# Altium footprint library Amirreza.PcbLib: 524 footprints (part 32 of 33)
Each footprint in its own frame and in the unit in brackets; x right, y up, seen from the top. Pads: shape width x height; smd on the part's side, far side on the other; paste and mask are expansions set on the pad; w line width, h text height; cw(c..) or ccw(c..) is an arc to the next point about the centre after c.
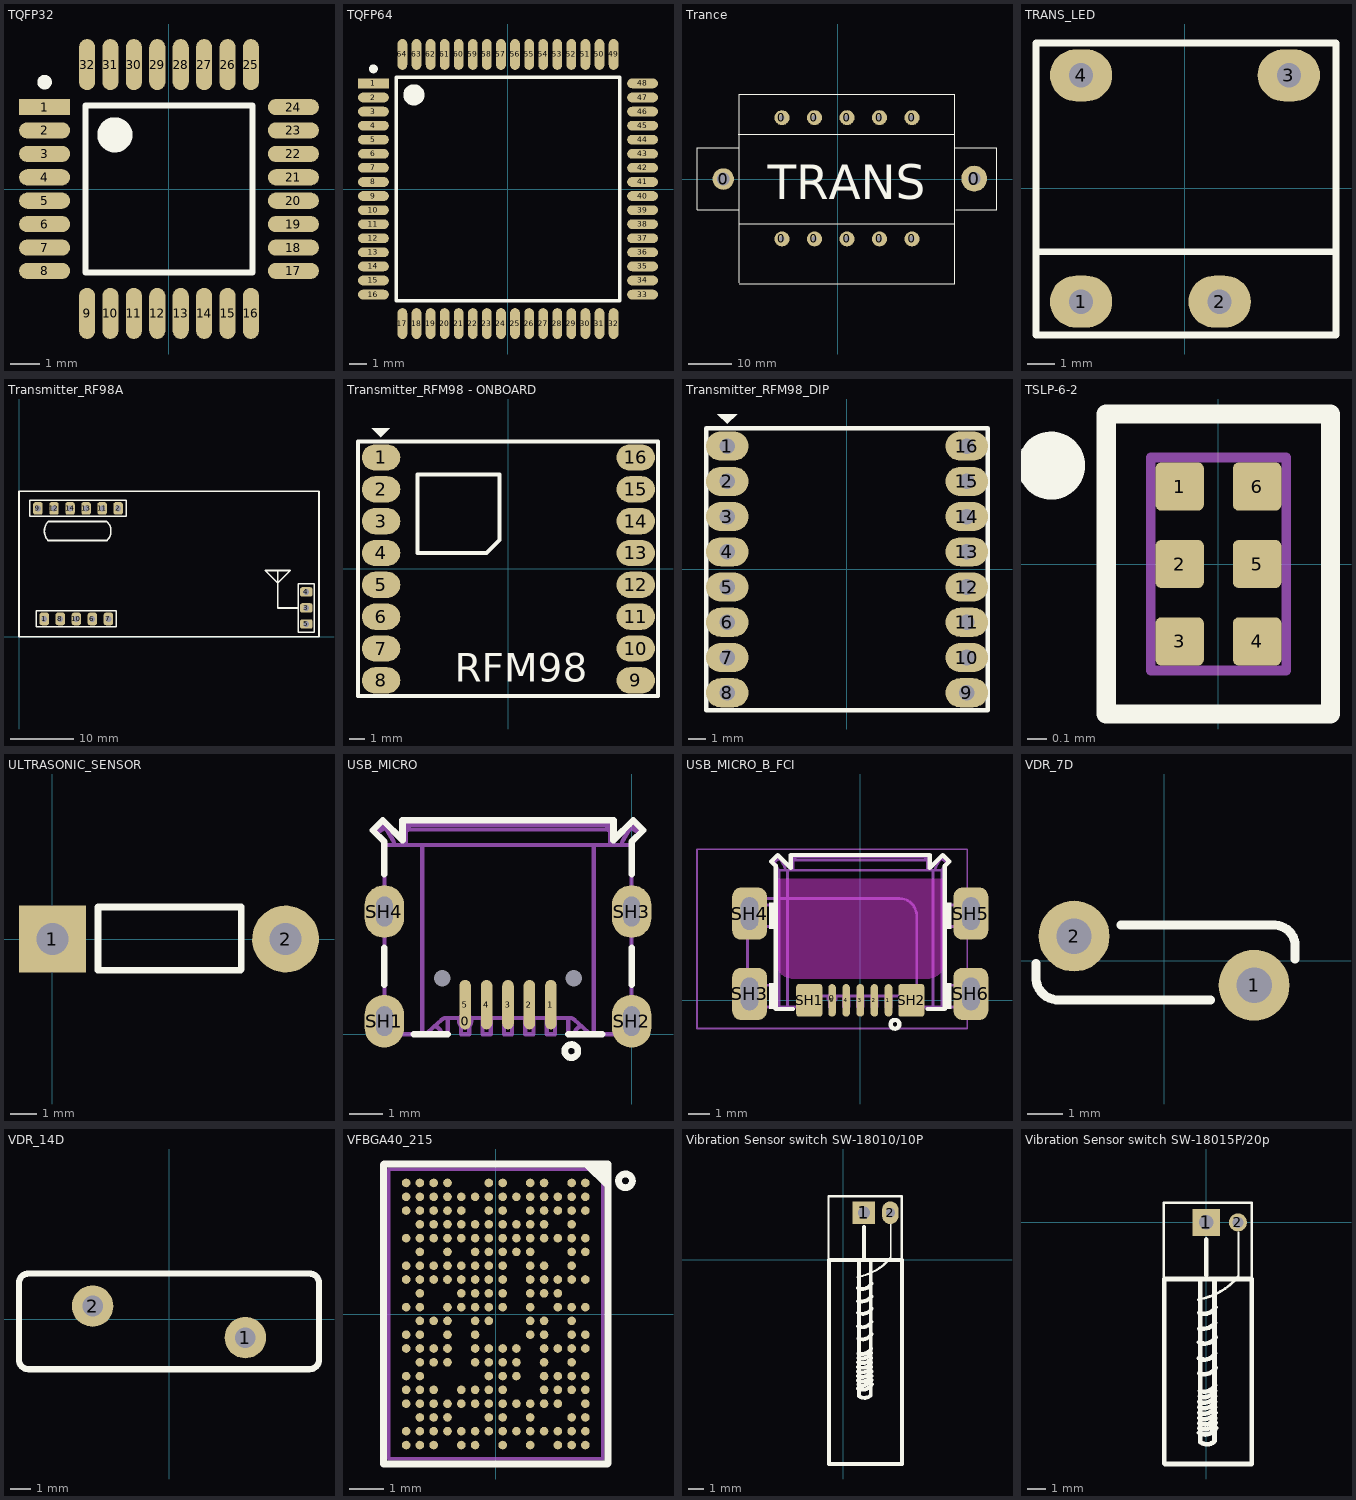
[diagram p31: the footprints below, top view; thin cyan lines are the x and y axes]

## TQFP32 [mm] "Thin QFP, 32-Leads, Body 7x7mm, Pitch 0.8mm, IPC Low Density"
height 1.2
pads (32):
  rect 1.75x0.55 smd: 1(-4.25,2.8)
  oval 1.75x0.55 smd: 2(-4.25,2) 3(-4.25,1.2) 4(-4.25,0.4) 5(-4.25,-0.4) 6(-4.25,-1.2) 7(-4.25,-2) 8(-4.25,-2.8) 17(4.25,-2.8) 18(4.25,-2) 19(4.25,-1.2) 20(4.25,-0.4) 21(4.25,0.4) 22(4.25,1.2) 23(4.25,2) 24(4.25,2.8)
  oval 0.55x1.75 smd: 9(-2.8,-4.25) 10(-2,-4.25) 11(-1.2,-4.25) 12(-0.4,-4.25) 13(0.4,-4.25) 14(1.2,-4.25) 15(2,-4.25) 16(2.8,-4.25) 25(2.8,4.25) 26(2,4.25) 27(1.2,4.25) 28(0.4,4.25) 29(-0.4,4.25) 30(-1.2,4.25) 31(-2,4.25) 32(-2.8,4.25)
Top Overlay:
  circle w0.25: c-4.25,3.65 r0.125
  circle w0.6: c-1.85,1.85 r0.3
  lines w0.2: -2.85,-2.85 -2.85,2.85 2.85,2.85 2.85,-2.85 -2.85,-2.85
3D body "User Library-TQFP32-1 (1).step": height 1.1, standoff 0, extent -4.509,-4.509 4.509,4.509

## TQFP64 [mm]
pads (64):
  rect 1.75x0.55 smd: 1(-7.65,6)
  oval 1.75x0.55 smd: 2(-7.65,5.2) 3(-7.65,4.4) 4(-7.65,3.6) 5(-7.65,2.8) 6(-7.65,2) 7(-7.65,1.2) 8(-7.65,0.4) 9(-7.65,-0.4) 10(-7.65,-1.2) 11(-7.65,-2) 12(-7.65,-2.8) 13(-7.65,-3.6) 14(-7.65,-4.4) 15(-7.65,-5.2) 16(-7.65,-6) 33(7.65,-6) 34(7.65,-5.2) 35(7.65,-4.4) 36(7.65,-3.6) 37(7.65,-2.8) 38(7.65,-2) 39(7.65,-1.2) 40(7.65,-0.4) 41(7.65,0.4) 42(7.65,1.2) 43(7.65,2) 44(7.65,2.8) 45(7.65,3.6) 46(7.65,4.4) 47(7.65,5.2) 48(7.65,6)
  oval 0.55x1.75 smd: 17(-6,-7.65) 18(-5.2,-7.65) 19(-4.4,-7.65) 20(-3.6,-7.65) 21(-2.8,-7.65) 22(-2,-7.65) 23(-1.2,-7.65) 24(-0.4,-7.65) 25(0.4,-7.65) 26(1.2,-7.65) 27(2,-7.65) 28(2.8,-7.65) 29(3.6,-7.65) 30(4.4,-7.65) 31(5.2,-7.65) 32(6,-7.65) 49(6,7.65) 50(5.2,7.65) 51(4.4,7.65) 52(3.6,7.65) 53(2.8,7.65) 54(2,7.65) 55(1.2,7.65) 56(0.4,7.65) 57(-0.4,7.65) 58(-1.2,7.65) 59(-2,7.65) 60(-2.8,7.65) 61(-3.6,7.65) 62(-4.4,7.65) 63(-5.2,7.65) 64(-6,7.65)
Top Overlay:
  circle w0.25: c-7.65,6.825 r0.125
  circle w0.6: c-5.35,5.35 r0.3
  lines w0.2: -6.35,-6.35 -6.35,6.35 6.35,6.35 6.35,-6.35 -6.35,-6.35
3D body "User Library-TQFP64-4.STEP": height 1.6, standoff 0, extent -7.983,-7.991 8.017,8.009

## Trance [mm]
pads (12):
  round 5 hole 3: 0(-26.594,0)
  round 3.5 hole 1.27: 0(-12.929,-13.94) 0(-12.929,14.275) 0(-5.359,-13.94) 0(-5.359,14.28) 0(2.21,-13.94) 0(2.21,14.28) 0(9.779,-13.94) 0(9.779,14.28) 0(17.348,-13.94) 0(17.348,14.28)
  round 6 hole 3: 0(31.826,0.102)
Top Overlay:
  lines w0.254: -23.063,7.295 -32.715,7.295 -32.715,-7.183 -22.936,-7.183 ; -23.063,10.47 27.356,10.47 ; -22.936,-24.328 27.356,-24.328 27.356,19.69 -22.936,19.69 -22.936,-24.201 ; -22.936,-10.358 27.356,-10.358 ; 27.356,7.295 37.135,7.295 37.135,-7.056 ; 27.483,-7.183 37.135,-7.183
  text "TRANS" at -16.264,-4.743 h8

## TRANS_LED [mil]
pads (4):
  oval 90x75 hole 35: 1(-150,-163.39) 2(50,-163.39) 3(150,163.39) 4(-150,163.39)
Top Overlay:
  lines w10: -215.07,-91.39 218,-91.39 ; -215.07,-211.39 -215.07,209.87 218,209.87 218,-211.39 -215.07,-211.39
3D body "User Library-EE1112.STEP": height 479.67, standoff -55.76, extent -215.54,-217.07 217.54,216

## Transmitter_RF98A [mm]
pads (14):
  rrect50% 1.5x2 hole 0.9: 1(4,2.8) 2(15.7,20.3) 6(11.62,2.8) 7(14.16,2.8) 8(6.54,2.8) 9(3,20.3) 10(9.08,2.8) 11(13.16,20.3) 12(5.54,20.3) 13(10.62,20.3) 14(8.08,20.3)
  rrect50% 2x1.5 hole 0.9: 3(45.5,4.54) 4(45.5,7.08) 5(45.5,2)
Top Overlay:
  lines w0.2: 1.73,19.03 16.97,19.03 16.97,21.57 1.73,21.57 1.73,19.03 ; 2.73,1.53 2.73,4.07 15.43,4.07 15.43,1.53 2.73,1.53 ; 44.23,0.73 44.23,8.35 46.77,8.35 46.77,0.73 44.23,0.73
  lines w0.254: 4.65,15.189 cw(c6.174,16.713) 4.65,18.237 ; 13.921,15.189 ccw(c12.397,16.713) 13.921,18.237 ; 40.97,10.389 40.97,8.484 ; 44.23,4.54 40.97,4.54 40.97,8.484 ; 40.97,8.484 42.951,10.465 ; 40.97,8.484 38.989,10.465 42.951,10.465 ; 40.97,8.484 42.951,10.465 ; 0,0 47.5,0 47.5,23 0,23 0,0
  lines w0.305: 4.699,15.189 13.843,15.189 ; 4.699,18.237 13.843,18.237

## Transmitter_RFM98 - ONBOARD [mil]
pads (16):
  oval 95x65 smd: 1(-314.96,275.59) 2(-314.96,196.85) 3(-314.96,118.11) 4(-314.96,39.37) 5(-314.96,-39.37) 6(-314.96,-118.11) 7(-314.96,-196.85) 8(-314.96,-275.59) 9(314.96,-275.59) 10(314.96,-196.85) 11(314.96,-118.11) 12(314.96,-39.37) 13(314.96,39.37) 14(314.96,118.11) 15(314.96,196.85) 16(314.96,275.59)
Top Overlay:
  region: -315.24,325.13 -337.51,347.4 -292.96,347.4
  lines w10: -371.96,-314.33 370.04,-314.33 370.04,315.59 -371.96,315.59 -371.96,-314.33 ; -224.96,39.41 -224.96,233.41 -21.96,233.41 -21.96,71.41 -53.96,39.41 -224.96,39.41
  text "RFM98" at -132.96,-302.59 h120
3D body "User Library-RFM96W.STEP": height 90.24, standoff 2.36, extent -314,-313.99 316,311.99

## Transmitter_RFM98_DIP [mil]
pads (16):
  oval 95x65 hole 35: 1(-267.68,274.96) 2(-267.68,196.22) 3(-267.68,117.48) 4(-267.68,38.74) 5(-267.68,-40) 6(-267.68,-118.74) 7(-267.68,-197.48) 8(-267.68,-276.22) 9(267.76,-276.22) 10(267.76,-197.48) 11(267.76,-118.74) 12(267.76,-40) 13(267.76,38.74) 14(267.76,117.48) 15(267.76,196.22) 16(267.76,274.96)
Top Overlay:
  region: -268.04,324.5 -290.31,346.77 -245.76,346.77
  lines w10: -314.96,-314.96 -314.96,314.96 314.96,314.96 314.96,-314.96 -314.96,-314.96
3D body "User Library-RFM96W.STEP": height 336.31, standoff 248.43, extent -315.04,-312.99 314.96,312.99
3D body "User Library-PBS2-8.STEP": height 169.29, standoff -124.02, extent 228.39,-315.59 307.13,314.33
3D body "User Library-PBS2-8.STEP": height 169.29, standoff -124.02, extent -307.13,-315.59 -228.39,314.33
3D body "User Library-pls2-8_asm.STEP": height 358.27, standoff 11.81, extent -307.13,-315.59 -228.39,314.33
3D body "User Library-pls2-8_asm.STEP": height 358.27, standoff 11.81, extent 228.31,-315.59 307.05,314.33

## TSLP-6-2 [mm] "0.7 x 1.1 mm2_6-PIN"
pads (6):
  rrect25% 0.25x0.25 smd: 1(-0.2,0.4) 2(-0.2,0) 3(-0.2,-0.4) 4(0.2,-0.4) 5(0.2,0) 6(0.2,0.4)
Top Overlay:
  circle w0.25: c-0.864,0.508 r0.05
  lines w0.1: -0.579,-0.775 -0.579,0.775 0.579,0.775 0.579,-0.775 -0.579,-0.775
Top Assembly:
  lines w0.05: -0.35,-0.55 0.35,-0.55 0.35,0.55 -0.35,0.55 -0.35,-0.55
3D body "User Library-SOT8006.STEP": height 0.4, standoff 0, extent -0.4,-0.654 0.4,0.654

## ULTRASONIC_SENSOR [mm]
pads (2):
  rect 2.5x2.5 hole 1.2: 1(0,0)
  round 2.5 hole 1.2: 2(8.722,0)
Top Overlay:
  lines w0.254: 7.036,-1.168 1.702,-1.168 1.702,1.194 7.061,1.194 7.061,-1.118

## USB_MICRO [mm] "CONN, USB Micro AB"
height 2.286
pads (12):
  round 0 hole 0.5 unplated: 0(-5.75,1.7) 0(-1.75,1.7)
  round 0.508 on Mech15: 0(-5.05,0.4)
  oval 0.35x1.5 smd: 1(-2.45,0.9) 2(-3.1,0.9) 3(-3.75,0.9) 4(-4.4,0.9) 5(-5.05,0.9)
  oval 1.2x1.6 hole 0.5 slot 0.9 at 90 deg: SH1(-7.5,0.4) SH2(0,0.4) SH3(0,3.725) SH4(-7.5,3.725)
Top Overlay:
  circle w0.2: c-1.829,-0.508 r0.2
  lines w0.2: -7.5,1.502 -7.5,2.629 ; -7.5,4.857 -7.5,5.842 -7.85,6.192 -7.55,6.492 -6.95,5.892 -6.95,6.492 -0.55,6.492 -0.55,5.892 0.05,6.492 0.35,6.192 0,5.842 0,4.857 ; -6.604,0 -5.575,0 ; -1.925,0 -0.896,0 ; 0,1.502 0,2.629
Mechanical 13:
  lines w0.127: -7.72,6.123 -7.46,6.273 ; -7.2,5.741 ccw(c-7.5,5.742) -7.24,5.892 -7.51,6.359 -7.77,6.209 -7.5,5.741 ; -6.85,6.123 cw(c-6.756,6.115) -6.75,6.209 ; -6.35,0 -6.35,5.741 ; -6.276,0 -6.276,0.007 ; -5.979,0.247 cw(c-6.025,0) -5.774,0 -5.575,0 -5.575,0.5 ; -5.175,0.5 -5.175,0 -4.925,0 -4.925,0.5 ; -4.525,0.5 -4.525,0 -4.275,0 -4.275,0.5 ; -3.875,0.5 -3.875,0 -3.625,0 -3.625,0.5 ; -3.225,0.5 -3.225,0 -2.975,0 -2.975,0.5 ; -2.575,0.5 -2.575,0 -2.325,0 -2.325,0.5 ; -1.925,0.5 -1.925,0 -1.726,0 cw(c-1.475,0) -1.521,0.247 ; -1.224,0 -1.224,0.007 ; -1.15,0 -1.15,5.741 ; -0.65,6.123 ccw(c-0.744,6.115) -0.75,6.209 ; -0.3,5.741 cw(c0,5.742) -0.26,5.892 0.01,6.359 0.27,6.209 0,5.741 ; -0.04,6.273 0.22,6.123 ; -7.5,5.741 -6.85,5.742 ; -7.5,5.741 -7.5,0 -6.327,0 ccw(c-6.327,0.2) -6.193,0.052 -5.757,0.448 cw(c-5.623,0.3) -5.623,0.5 -1.877,0.5 cw(c-1.877,0.3) -1.743,0.448 -1.307,0.052 ccw(c-1.173,0.2) -1.173,0 0,0 0,5.741 ; -6.85,5.742 -0.65,5.742 ; -6.85,5.742 -6.85,6.273 cw(c-6.756,6.265) -6.75,6.359 ; -6.75,6.209 -0.75,6.209 ; -6.75,6.209 -6.75,6.359 ; -6.75,6.359 -0.75,6.359 ; -0.75,6.209 -0.75,6.359 ; -0.75,6.359 cw(c-0.744,6.265) -0.65,6.273 -0.65,5.742 ; -0.65,5.742 0,5.741
3D body "u254-05xx-4bh83-f1s.stp": height 2.35, standoff -0.7, extent -7.461,0.551 -0.047,6.001

## USB_MICRO_B_FCI [mm] "CONN, USB Micro AB"
height 2.286
pads (12):
  round 0.508 on Mech15: 0(-1.3,0.1)
  oval 0.35x1.5 smd: 1(1.3,0) 2(0.65,0) 3(0,0) 4(-0.65,0) 5(-1.3,0)
  rrect20% 1.2x1.5 smd: SH1(-2.35,0) SH2(2.35,0)
  rrect50% 1.6x2.4 hole 0.8 slot 1.5 at 90 deg: SH3(-5.1,0.3) SH4(-5.1,4) SH5(5.1,4) SH6(5.1,0.3)
Top Overlay:
  circle w0.2: c1.6,-1.1 r0.2
  rectangle: -4.2,-0.4 -3.8,0.8
  region: 4.2,0.8 3.8,0.8 3.8,-0.4 4.2,-0.4
  region: 4.2,4.5 3.8,4.5 3.8,3.3 4.2,3.3
  rectangle: -4.2,3.3 -3.8,4.5
  lines w0.2: -3.9,-0.4 -3.1,-0.4 ; -3.9,0.8 -3.9,3.3 ; -3.9,4.5 -3.9,6.2 -4.1,6.4 -3.8,6.7 -3.2,6.1 -3.2,6.7 3.2,6.7 3.2,6.1 3.8,6.7 4.1,6.4 3.9,6.2 3.9,4.5 ; 3.1,-0.4 3.9,-0.4 ; 3.9,0.8 3.9,3.3
Keep-Out Layer:
  board cut-out: 3.9,5.6 3.9,1.803 3.9,1.725 3.869,1.57 3.809,1.425 3.721,1.293 3.61,1.182 3.479,1.094 3.333,1.034 3.179,1.003 3.1,1.003 -3.1,1.003 -3.179,1.003 -3.333,1.034 -3.479,1.094 -3.61,1.182 -3.721,1.293 -3.809,1.425 -3.869,1.57 -3.9,1.725 -3.9,1.803 -3.9,5.6
Mechanical 13:
  lines w0.127: -4.85,-0.3 -4.85,0.7 ; -4.85,3.4 -4.85,4.4 ; -3.97,6.381 -3.71,6.531 ; -3.85,-0.3 -3.85,0.7 ; -3.85,3.4 -3.85,4.4 ; -3.75,-0.3 -3.75,6 ; -3.75,0.7 -5.25,0.7 -5.25,-0.3 -2.577,-0.3 ccw(c-2.577,-0.1) -2.443,-0.248 -2.007,0.148 cw(c-1.873,0) -1.873,0.2 1.873,0.2 cw(c1.873,0) 2.007,0.148 2.443,-0.248 ccw(c2.577,-0.1) 2.577,-0.3 5.25,-0.3 5.25,0.7 3.75,0.7 ; -3.75,3.4 -5.25,3.4 -5.25,4.4 -3.75,4.4 ; -3.45,6 ccw(c-3.75,6.001) -3.49,6.151 -3.76,6.618 -4.02,6.468 -3.75,6 ; -3.35,-0.3 -3.35,6 ; -3.1,6.381 cw(c-3.006,6.374) -3,6.468 ; -2.526,-0.3 -2.526,-0.293 ; -2.229,-0.053 cw(c-2.275,-0.3) -2.024,-0.3 -1.825,-0.3 -1.825,0.2 ; -1.425,0.2 -1.425,-0.3 -1.175,-0.3 -1.175,0.2 ; -0.775,0.2 -0.775,-0.3 -0.525,-0.3 -0.525,0.2 ; -0.125,0.2 -0.125,-0.3 0.125,-0.3 0.125,0.2 ; 0.525,0.2 0.525,-0.3 0.775,-0.3 0.775,0.2 ; 1.175,0.2 1.175,-0.3 1.425,-0.3 1.425,0.2 ; 1.825,0.2 1.825,-0.3 2.024,-0.3 cw(c2.275,-0.3) 2.229,-0.053 ; 2.526,-0.3 2.526,-0.293 ; 3.1,6.381 ccw(c3.006,6.374) 3,6.468 ; 3.35,-0.3 3.35,6 ; 3.45,6 cw(c3.75,6.001) 3.49,6.151 3.76,6.618 4.02,6.468 3.75,6 ; 3.71,6.531 3.97,6.381 ; 3.75,-0.3 3.75,6 ; 3.75,3.4 5.25,3.4 5.25,4.4 3.75,4.4 ; 3.85,-0.3 3.85,0.7 ; 3.85,3.4 3.85,4.4 ; 4.85,-0.3 4.85,0.7 ; 4.85,3.4 4.85,4.4 ; -3.75,6 -3.1,6 ; -3.1,6 -3.1,6.531 cw(c-3.006,6.524) -3,6.618 ; -3.1,6.001 3.1,6 ; -3,6.468 -3,6.618 ; -3,6.468 3,6.468 ; -3,6.618 3,6.618 ; 3,6.468 3,6.618 ; 3,6.618 cw(c3.006,6.524) 3.1,6.531 3.1,6 ; 3.1,6 3.75,6
Mechanical 15:
  lines w0.076: -7.523,-1.297 -7.523,6.958 4.923,6.958 4.923,-1.297 -7.523,-1.297
  lines w0.127: -5.2,0.1 -5.2,3.897 cw(c-4.4,3.897) -4.4,4.697 1.8,4.697 cw(c1.8,3.897) 2.6,3.897 2.6,0.1
3D body "Micro USB B-type mid-mount FCI.STEP": height 2.15, standoff -0.92, extent -5.25,-0.3 5.25,6.618
3D body "USB Micro B plug.STEP": height 4.67, standoff -3.53, extent -5.35,2.579 5.35,27.079

## VDR_7D [mm]
pads (2):
  round 2 hole 1: 1(2.54,-0.694)
  round 2 hole 1 paste-2539.97: 2(-2.54,0.694)
Top Overlay:
  lines w0.254: -3.609,-0.076 -3.609,-0.423 ccw(c-2.987,-0.483) -3.047,-1.106 ; -3.047,-1.106 1.309,-1.106 ; -1.219,1.001 3.137,1.001 cw(c3.113,0.415) 3.699,0.391 3.699,0.045
3D body "71071339.stp": height 12.3, standoff -21.7, extent -4.497,-1.786 4.497,1.786

## VDR_14D [mm]
pads (2):
  round 2 hole 1: 1(3.683,-0.889)
  round 2 hole 1 paste-2539.97: 2(-3.683,0.635)
Top Overlay:
  lines w0.3: -7.239,-1.956 ccw(c-6.782,-1.956) -6.782,-2.413 6.782,-2.413 ccw(c6.782,-1.956) 7.239,-1.956 7.239,1.746 ccw(c6.782,1.746) 6.782,2.203 -5.714,2.203 -6.782,2.203 ccw(c-6.782,1.746) -7.239,1.746 -7.239,-1.956
3D body "User Library-14d471k.step": height 14.5, standoff -4.5, extent -7.248,-2.456 7.248,2.202

## VFBGA40_215 [mm] "VFBGA; 215 Balls; Body 8.4 x 6.2mm; Pitch 0.4mm"
height 1
pads (215):
  round 0.25 smd mask+0.075: A1(2.6,3.8) A2(2.6,3.4) A3(2.6,3) A5(2.6,2.2) A6(2.6,1.8) A8(2.6,1) A10(2.6,0.2) A12(2.6,-0.6) A13(2.6,-1) A15(2.6,-1.8) A16(2.6,-2.2) A17(2.6,-2.6) A18(2.6,-3) A19(2.6,-3.4) A20(2.6,-3.8) B1(2.2,3.8) B2(2.2,3.4) B3(2.2,3) B4(2.2,2.6) B5(2.2,2.2) B6(2.2,1.8) B7(2.2,1.4) B8(2.2,1) B10(2.2,0.2) B11(2.2,-0.2) B12(2.2,-0.6) B13(2.2,-1) B14(2.2,-1.4) B15(2.2,-1.8) B16(2.2,-2.2) B18(2.2,-3) B19(2.2,-3.4) B20(2.2,-3.8) C2(1.8,3.4) C3(1.8,3) C5(1.8,2.2) C8(1.8,1) C9(1.8,0.6) C10(1.8,0.2) C13(1.8,-1) C15(1.8,-1.8) C16(1.8,-2.2) C17(1.8,-2.6) C19(1.8,-3.4) C20(1.8,-3.8) D1(1.4,3.8) D2(1.4,3.4) D3(1.4,3) D4(1.4,2.6) D5(1.4,2.2) D7(1.4,1.4) D8(1.4,1) D9(1.4,0.6) D11(1.4,-0.2) D12(1.4,-0.6) D13(1.4,-1) D14(1.4,-1.4) D15(1.4,-1.8) D16(1.4,-2.2) D17(1.4,-2.6) D19(1.4,-3.4) E1(1,3.8) E2(1,3.4) E3(1,3) E4(1,2.6) E5(1,2.2) E6(1,1.8) E7(1,1.4) E8(1,1) E9(1,0.6) E10(1,0.2) E11(1,-0.2) E12(1,-0.6) E17(1,-2.6) E18(1,-3) E19(1,-3.4) E20(1,-3.8) F2(0.6,3.4) F4(0.6,2.6) F5(0.6,2.2) F6(0.6,1.8) F13(0.6,-1) F14(0.6,-1.4) F15(0.6,-1.8) F17(0.6,-2.6) F19(0.6,-3.4) G1(0.2,3.8) G2(0.2,3.4) G3(0.2,3) G4(0.2,2.6) G5(0.2,2.2) G6(0.2,1.8) G7(0.2,1.4) G8(0.2,1) G9(0.2,0.6) G10(0.2,0.2) G13(0.2,-1) G14(0.2,-1.4) G15(0.2,-1.8) G16(0.2,-2.2) G17(0.2,-2.6) G18(0.2,-3) G19(0.2,-3.4) G20(0.2,-3.8) H1(-0.2,3.8) H2(-0.2,3.4) H3(-0.2,3) H4(-0.2,2.6) H5(-0.2,2.2) H6(-0.2,1.8) H7(-0.2,1.4) H8(-0.2,1) H9(-0.2,0.6) H10(-0.2,0.2) H11(-0.2,-0.2) H13(-0.2,-1) H14(-0.2,-1.4) H15(-0.2,-1.8) H16(-0.2,-2.2) H17(-0.2,-2.6) H18(-0.2,-3) H19(-0.2,-3.4) J2(-0.6,3.4) J4(-0.6,2.6) J5(-0.6,2.2) J6(-0.6,1.8) J7(-0.6,1.4) J8(-0.6,1) J9(-0.6,0.6) J10(-0.6,0.2) J11(-0.6,-0.2) J12(-0.6,-0.6) J13(-0.6,-1) J14(-0.6,-1.4) J16(-0.6,-2.2) J17(-0.6,-2.6) J19(-0.6,-3.4) J20(-0.6,-3.8) K2(-1,3.4) K3(-1,3) K4(-1,2.6) K5(-1,2.2) K7(-1,1.4) K8(-1,1) K9(-1,0.6) K10(-1,0.2) K16(-1,-2.2) K17(-1,-2.6) K19(-1,-3.4) K20(-1,-3.8) L1(-1.4,3.8) L2(-1.4,3.4) L3(-1.4,3) L4(-1.4,2.6) L5(-1.4,2.2) L6(-1.4,1.8) L7(-1.4,1.4) L8(-1.4,1) L10(-1.4,0.2) L11(-1.4,-0.2) L12(-1.4,-0.6) L13(-1.4,-1) L14(-1.4,-1.4) L17(-1.4,-2.6) L18(-1.4,-3) L19(-1.4,-3.4) M1(-1.8,3.8) M2(-1.8,3.4) M3(-1.8,3) M4(-1.8,2.6) M5(-1.8,2.2) M7(-1.8,1.4) M8(-1.8,1) M11(-1.8,-0.2) M13(-1.8,-1) M14(-1.8,-1.4) M16(-1.8,-2.2) M17(-1.8,-2.6) M18(-1.8,-3) M19(-1.8,-3.4) M20(-1.8,-3.8) N1(-2.2,3.8) N2(-2.2,3.4) N3(-2.2,3) N4(-2.2,2.6) N5(-2.2,2.2) N6(-2.2,1.8) N7(-2.2,1.4) N8(-2.2,1) N9(-2.2,0.6) N10(-2.2,0.2) N11(-2.2,-0.2) N12(-2.2,-0.6) N13(-2.2,-1) N14(-2.2,-1.4) N15(-2.2,-1.8) N16(-2.2,-2.2) N17(-2.2,-2.6) N18(-2.2,-3) N19(-2.2,-3.4) N20(-2.2,-3.8) P1(-2.6,3.8) P2(-2.6,3.4) P3(-2.6,3) P5(-2.6,2.2) P7(-2.6,1.4) P8(-2.6,1) P10(-2.6,0.2) P12(-2.6,-0.6) P13(-2.6,-1) P15(-2.6,-1.8) P16(-2.6,-2.2) P17(-2.6,-2.6) P19(-2.6,-3.4) P20(-2.6,-3.8)
Top Overlay:
  circle w0.2: c3.76,3.862 r0.2
  region: 2.635,4.337 3.235,3.737 3.235,4.337
  lines w0.2: -3.25,4.341 -3.25,-4.35 3.246,-4.35 ; -3.246,4.35 3.25,4.35 3.25,-4.341 ; 2.635,4.337 3.235,3.737
Mechanical 13:
  lines w0.1: -3.1,-4.2 3.1,-4.2 3.1,4.2 -3.1,4.2 -3.1,-4.2
3D body "User Library-56-VFBGA.STEP": height 0.71, standoff -0.03, extent -2.669,-4.045 2.651,3.985

## Vibration Sensor switch SW-18010/10P [mm]
pads (2):
  rect 1.5x1.5 hole 0.8: 1(1.366,3.124)
  oval 1.1x1.5 hole 0.6: 2(3.119,3.124)
Top Overlay:
  lines w0.1: 3.144,0.152 3.144,2.565
  lines w0.15: -0.97,0.051 -0.97,4.216 3.881,4.216 3.881,0 3.729,0 ; 0.943,-1.137 ccw(c0.251,2.575) 3.127,0.129
  lines w0.254: -0.945,-13.5 -0.945,0 3.754,0 ; -0.92,-13.5 3.881,-13.5 3.881,0 ; 0.965,-4.383 ccw(c1.257,-3.755) 1.864,-4.089 ; 0.967,-3.491 ccw(c1.281,-2.873) 1.888,-3.208 ; 0.969,-8.494 ccw(c1.303,-7.887) 1.91,-8.221 ; 0.973,-7.67 ccw(c1.27,-7.044) 1.877,-7.378 ; 0.978,-7.966 ccw(c1.267,-7.336) 1.874,-7.671 ; 0.979,-7.076 ccw(c1.252,-6.439) 1.859,-6.773 ; 0.979,-6.771 ccw(c1.252,-6.134) 1.859,-6.469 ; 0.982,-2.734 ccw(c1.162,-1.847) 1.862,-2.42 ; 0.984,-1.858 ccw(c1.27,-1.227) 1.877,-1.562 ; 0.988,-7.385 ccw(c1.252,-6.744) 1.859,-7.078 ; 0.993,-8.239 ccw(c1.278,-7.607) 1.885,-7.942 ; 0.993,-5.191 ccw(c1.278,-4.559) 1.885,-4.894 ; 1.011,-6.477 ccw(c1.245,-5.825) 1.852,-6.159 ; 1.018,-6.177 ccw(c1.252,-5.524) 1.859,-5.859 ; 1.036,-8.966 1.036,-0.051 ; 1.048,-9.001 ccw(c1.409,-8.526) 1.804,-8.973 ; 1.366,0.203 1.366,2.184 ; 1.824,-8.941 1.824,-0.127

## Vibration Sensor switch SW-18015P/20p [mm]
pads (2):
  rect 1.5x1.5 hole 0.8: 1(0,0)
  round 1 hole 0.6: 2(1.753,0)
Top Overlay:
  lines w0.1: 1.778,-2.972 1.778,-0.559
  lines w0.15: -2.337,-3.073 -2.337,1.092 2.515,1.092 2.515,-3.124 2.362,-3.124 ; -0.424,-4.261 ccw(c-1.116,-0.549) 1.761,-2.995
  lines w0.254: -2.311,-13.31 -2.311,-3.124 2.388,-3.124 ; -2.286,-13.335 2.515,-13.335 2.515,-3.124 ; -0.401,-7.507 ccw(c-0.109,-6.879) 0.498,-7.213 ; -0.399,-6.615 ccw(c-0.086,-5.997) 0.521,-6.332 ; -0.398,-11.618 ccw(c-0.064,-11.011) 0.543,-11.345 ; -0.394,-10.794 ccw(c-0.096,-10.168) 0.511,-10.502 ; -0.388,-11.09 ccw(c-0.099,-10.461) 0.508,-10.795 ; -0.387,-10.2 ccw(c-0.114,-9.563) 0.493,-9.898 ; -0.387,-9.895 ccw(c-0.114,-9.258) 0.493,-9.593 ; -0.384,-5.858 ccw(c-0.204,-4.971) 0.496,-5.544 ; -0.383,-4.982 ccw(c-0.096,-4.351) 0.511,-4.686 ; -0.378,-10.509 ccw(c-0.114,-9.868) 0.493,-10.202 ; -0.374,-11.363 ccw(c-0.089,-10.731) 0.518,-11.066 ; -0.374,-8.315 ccw(c-0.089,-7.683) 0.518,-8.018 ; -0.356,-9.601 ccw(c-0.122,-8.949) 0.485,-9.283 ; -0.348,-9.301 ccw(c-0.114,-8.649) 0.493,-8.983 ; -0.33,-12.09 -0.33,-3.175 ; -0.318,-12.125 ccw(c0.042,-11.651) 0.438,-12.097 ; 0,-2.921 0,-0.94 ; 0.457,-12.065 0.457,-3.251